# Altium footprint library Miscellaneous Base.PcbLib: 153 footprints (part 9 of 10)
Each footprint in its own frame and in the unit in brackets; x right, y up, seen from the top. Pads: shape width x height; smd on the part's side, far side on the other; paste and mask are expansions set on the pad; w line width, h text height; cw(c..) or ccw(c..) is an arc to the next point about the centre after c.
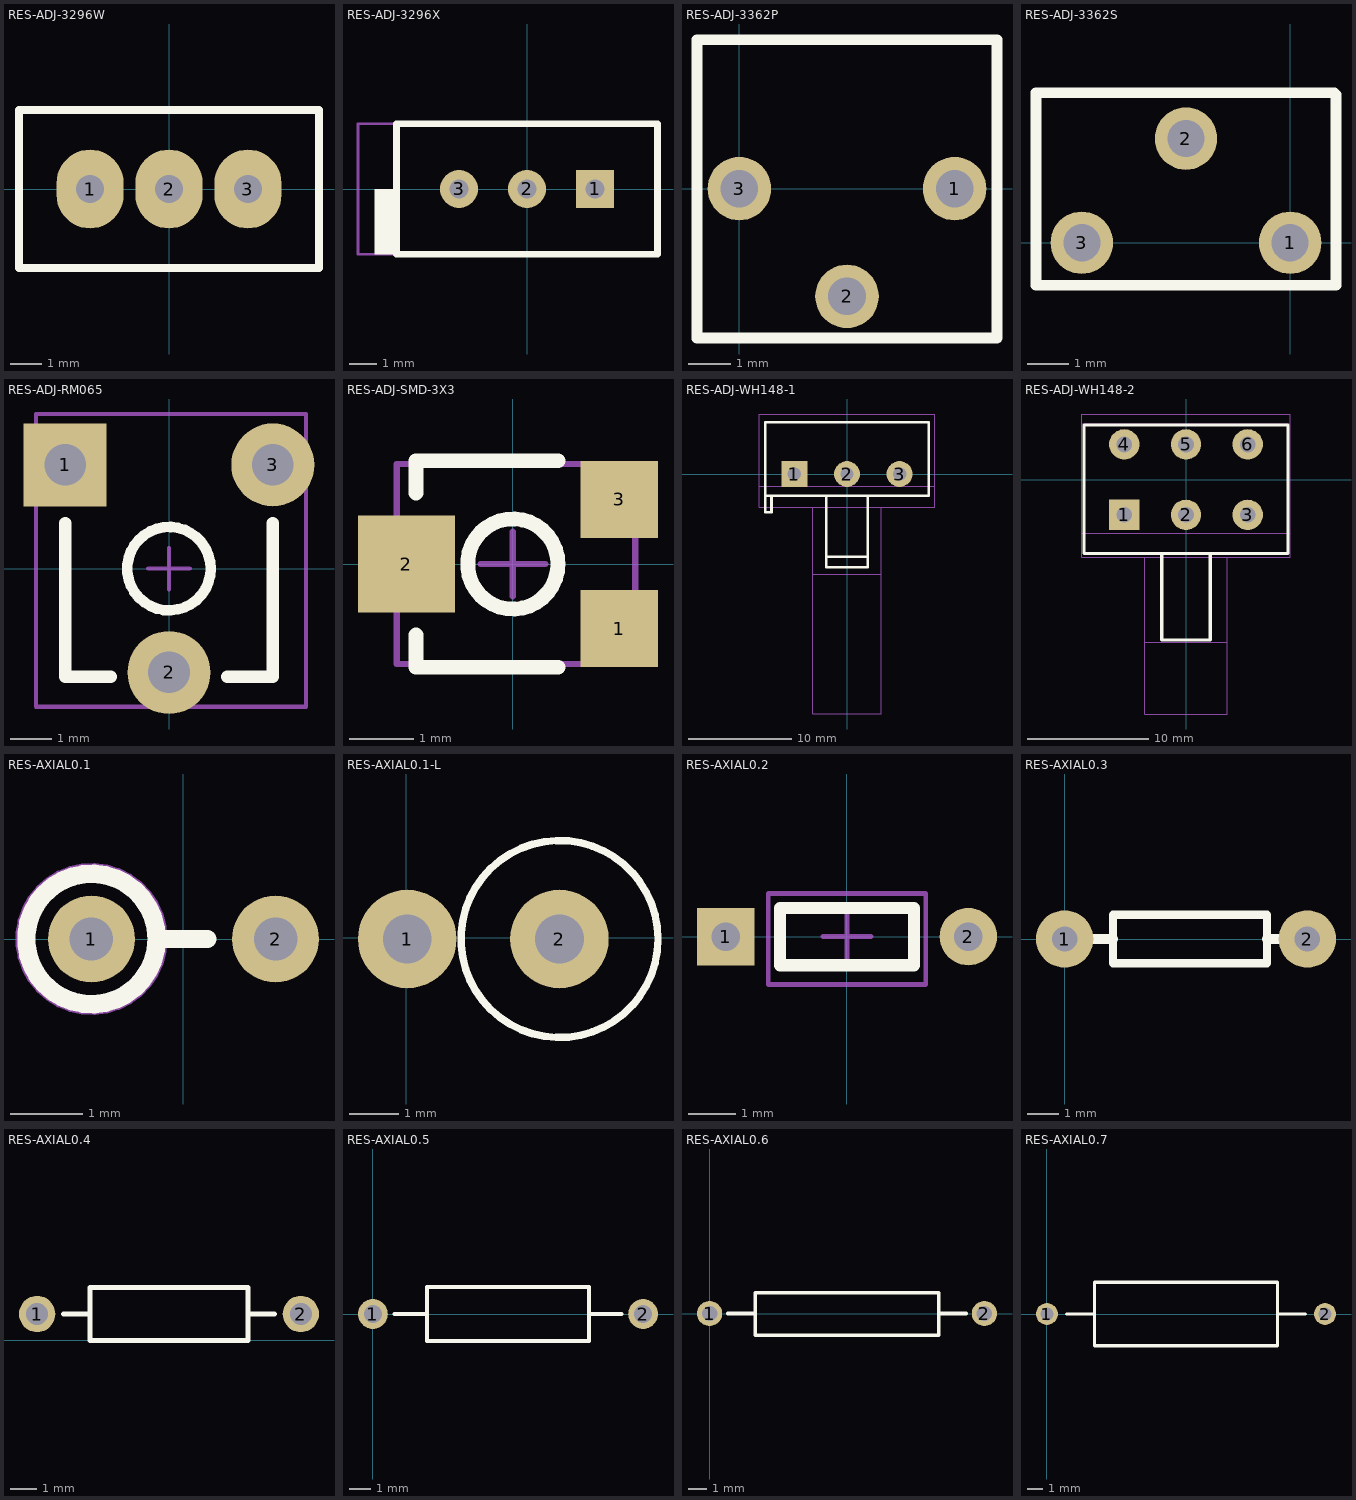
[diagram p8: the footprints below, top view; thin cyan lines are the x and y axes]

## RES-ADJ-3296W [mil]
pads (3):
  oval 85x100 hole 35: 1(-100,0) 2(0,0) 3(100,0)
Top Overlay:
  lines w10: -190,-100 -190,100 190,100 190,-100 -190,-100
3D body "User Library-3296W.step": height 454.72, standoff -62.99, extent -187.6,-94.49 187.6,94.49

## RES-ADJ-3296X [mm]
pads (3):
  rect 1.4x1.4 hole 0.7: 1(2.5,0)
  round 1.4 hole 0.7: 2(0,0) 3(-2.5,0)
Top Overlay:
  rectangle: -5.6,-2.4 -4.8,0
  lines w0.254: -4.8,-2.4 4.8,-2.4 4.8,2.4 -4.8,2.4 -4.8,-2.4
Mechanical 15:
  lines w0.1: -6.215,-2.4 -6.215,2.4 4.815,2.4 4.815,-2.4 -6.215,-2.4
3D body "3296X.STEP": height 10.03, standoff -1.6, extent -6.215,-2.4 4.815,2.4

## RES-ADJ-3362P [mm]
pads (3):
  round 1.5 hole 0.889: 1(5.08,0) 2(2.54,-2.54) 3(0,0)
Top Overlay:
  lines w0.254: -1,-3.531 -1,3.516 ; -1,-3.524 6.08,-3.524 ; -0.991,3.516 6.08,3.516 6.08,-3.505
3D body "3362P.STEP": height 4.7, standoff -5.47, extent -0.76,-3.3 5.84,3.754

## RES-ADJ-3362S [mm]
pads (3):
  round 1.5 hole 0.889: 1(0,0) 2(-2.5,2.5) 3(-5,0)
Top Overlay:
  lines w0.254: -6.1,-1.016 1.1,-1.016 ; -6.1,-1.016 -6.1,3.596 1.06,3.596 1.1,3.556 1.1,-1.016 ; -6.1,-1.016 1.1,-1.016
3D body "3362S.STEP": height 7.11, standoff -5.39, extent -5.84,-1.268 0.76,3.432

## RES-ADJ-RM065 [mm]
pads (3):
  rect 2x2 hole 1: 1(-2.5,2.5)
  round 2 hole 1: 2(0,-2.5) 3(2.5,2.5)
Top Overlay:
  circle w0.254: c0,0 r1.005
  lines w0.3: -2.5,1.1 -2.5,-2.6 -1.4,-2.6 ; 1.4,-2.6 2.5,-2.6 2.5,1.1
Mechanical 15:
  lines w0.1: -0.5,0 0.5,0 ; 0,-0.5 0,0.5 ; -3.2,-3.325 3.3,-3.325 3.3,3.725 -3.2,3.725 -3.2,-3.325
3D body "RESVAR.STEP": height 7.5, standoff -3.4, extent -3.2,-3.325 3.3,3.725

## RES-ADJ-SMD-3X3 [mm]
pads (3):
  rect 1.2x1.2 smd: 1(1.65,-1) 3(1.65,1)
  rect 1.5x1.5 smd: 2(-1.65,0)
Top Overlay:
  circle w0.23: c0,0 r0.7
  lines w0.23: -1.5,-1.1 -1.5,-1.6 0.7,-1.6 ; -1.5,1.1 -1.5,1.6 0.7,1.6
Mechanical 15:
  lines w0.1: -0.5,0 0.5,0 ; 0,-0.5 0,0.5 ; -1.8,-1.55 1.9,-1.55 1.9,1.55 -1.8,1.55 -1.8,-1.55
3D body "Res-Adj-PVZ3A.STEP": height 1.95, standoff 0, extent -1.795,-1.55 1.895,1.55

## RES-ADJ-WH148-1 [mm]
pads (3):
  rect 2.5x2.5 hole 1.3: 1(-5.08,0)
  round 2.5 hole 1.3: 2(0,0) 3(5.08,0)
Top Overlay:
  lines w0.254: -7.3,-2.1 -7.3,-3.7 -7.9,-3.7 -7.9,-2.1 ; -2,-2.1 -2,-8 ; 2,-2.2 2,-8 ; -7.9,-2.1 -7.9,5 7.9,5 7.9,-2.1 -7.9,-2.1 ; -2,-8 -2,-9 2,-9 2,-8 ; -2,-8 2,-8
Mechanical 15:
  lines w0.1: -3.3,-3.2 -3.3,-9.7 ; 3.3,-3.2 3.3,-9.7 ; -8.5,-1.2 -3.3,-1.2 3.3,-1.2 8.5,-1.2 ; -8.5,-1.2 -8.5,-3.2 8.5,-3.2 8.5,-1.2 ; -8.5,-1.2 -8.5,5.8 8.5,5.8 8.5,-1.2 ; -3.3,-9.7 -3.3,-23.2 3.3,-23.2 3.3,-9.7 ; -3.3,-9.7 3.3,-9.7
3D body "Potentiometer 4.STEP": height 20.62, standoff -4, extent -7.854,-20.558 7.894,5

## RES-ADJ-WH148-2 [mm]
pads (6):
  rect 2.5x2.5 hole 1.3: 1(-5.08,-2.9)
  round 2.5 hole 1.3: 2(0,-2.9) 3(5.08,-2.9) 4(-5.08,2.9) 5(0,2.9) 6(5.08,2.9)
Top Overlay:
  lines w0.254: -2,-6.1 -2,-10.9 -2,-13.2 2,-13.2 2,-10.9 2,-6.1 ; -8.4,-6.1 -8.4,4.5 8.4,4.5 8.4,-6.1 -8.4,-6.1
Mechanical 15:
  lines w0.1: -3.4,-11.3 -3.4,-19.3 3.4,-19.3 3.4,-11.3 ; -3.4,-6.4 -3.4,-13.4 3.4,-13.4 3.4,-6.4 ; -8.6,-4.4 -8.6,-6.4 8.6,-6.4 8.6,-4.4 ; -8.6,-4.4 -3.4,-4.4 3.4,-4.4 8.6,-4.4 ; -8.6,-4.4 -8.6,4.6 ; -8.6,4.6 -8.6,5.4 8.6,5.4 8.6,4.6 ; -8.6,4.6 8.6,4.6 ; 8.6,-4.4 8.6,4.6
3D body "Potentiometer 2.STEP": height 21.5, standoff -3, extent -8.5,-36.25 8.5,4.6

## RES-AXIAL0.1 [mm]
pads (2):
  round 1.2 hole 0.6: 1(-1.27,0) 2(1.27,0)
Top Overlay:
  circle w0.254: c-1.27,0 r0.9
  lines w0.254: -0.37,0 0.33,0
Mechanical 15:
  circle w0.1: c-1.27,0 r1
3D body "AXIAL0.1.STEP": height 6.75, standoff -2, extent -2.182,-0.9 1.53,0.941

## RES-AXIAL0.1-L [mil]
pads (2):
  round 79 hole 39: 1(0.95,-1) 2(123,-1)
Top Overlay:
  circle w6: c123,-1 r79
3D body "1W Carbon Film Resistor.STEP": height 572.61, standoff -75.5, extent -14.23,-84.35 206.23,81

## RES-AXIAL0.2 [mm] "1/6W"
pads (2):
  rect 1.2x1.2 hole 0.6: 1(-2.54,0)
  round 1.2 hole 0.6: 2(2.54,0)
Top Overlay:
  lines w0.254: -1.4,-0.6 1.4,-0.6 1.4,0.6 -1.4,0.6 -1.4,-0.6
Mechanical 15:
  lines w0.1: -0.5,0 0.5,0 ; 0,-0.5 0,0.5 ; -1.65,-1 1.65,-1 1.65,0.9 -1.65,0.9 -1.65,-1
3D body "AXIAL0.2.STEP": height 1.91, standoff -3, extent -2.78,-0.95 2.75,0.87

## RES-AXIAL0.3 [mm]
pads (2):
  round 1.8 hole 0.8: 1(0,0) 2(7.62,0)
Top Overlay:
  lines w0.254: 1.524,-0.762 6.35,-0.762 6.35,0.762 1.524,0.762 1.524,-0.762
  lines w0.305: 0.762,0 1.524,0 ; 6.35,0 6.858,0
3D body "RESISTOR 7_62MM DIP.step": height 1.25, standoff -2.75, extent -0.24,-1 7.86,1

## RES-AXIAL0.4 [mm] "1/4W/1/2W"
height 2.032
pads (2):
  round 1.4 hole 0.85: 1(3.302,1.016) 2(13.462,1.016)
Top Overlay:
  lines w0.2: 4.318,1.016 5.334,1.016 ; 11.43,1.016 12.446,1.016 ; 5.334,0 5.334,2.032 11.43,2.032 11.43,0 5.334,0
3D body "AXIAL-0.4-0.25W.STEP": height 2.63, standoff -2.64, extent 3.002,-0.244 13.762,2.276

## RES-AXIAL0.5 [mm] "1/2W/1W"
height 2.54
pads (2):
  round 1.4 hole 0.85: 1(0,0) 2(12.7,0)
Top Overlay:
  lines w0.2: 1.016,0 2.54,0 ; 10.16,0 11.684,0 ; 2.54,-1.27 2.54,1.27 10.16,1.27 10.16,-1.27 2.54,-1.27
3D body "User Library-Resistencia 0_5.STEP": height 3.1, standoff -1.5, extent -0.381,-1.461 13.081,1.397

## RES-AXIAL0.6 [mm] "Variable Resistor; 2 Leads"
height 2.54
pads (2):
  round 1.4 hole 0.85: 1(0,0) 2(15.24,0)
Top Overlay:
  lines w0.2: 1.016,0 2.54,0 ; 12.7,0 14.224,0 ; 2.54,-1.194 2.54,1.143 12.7,1.143 12.7,-1.194 2.54,-1.194
3D body "AXIAL06.STEP": height 2.5, standoff -0.8, extent -0.117,-1.351 15.443,1.249

## RES-AXIAL0.7 [mm] "Variable Resistor; 2 Leads"
height 4.064
pads (2):
  round 1.4 hole 0.85: 1(0,0) 2(17.78,0)
Top Overlay:
  lines w0.2: 1.27,0 3.048,0 ; 14.732,0 16.51,0 ; 3.048,-2.032 3.048,2.032 14.732,2.032 14.732,-2.032 3.048,-2.032
3D body "AXIAL07.STEP": height 4.3, standoff -1, extent -0.324,-2.413 18.136,2.187